# Altium footprint library MMT_Connectors_Buttons_Switches.PcbLib: 46 footprints (part 1 of 3)
Each footprint in its own frame and in the unit in brackets; x right, y up, seen from the top. Pads: shape width x height; smd on the part's side, far side on the other; paste and mask are expansions set on the pad; w line width, h text height; cw(c..) or ccw(c..) is an arc to the next point about the centre after c.
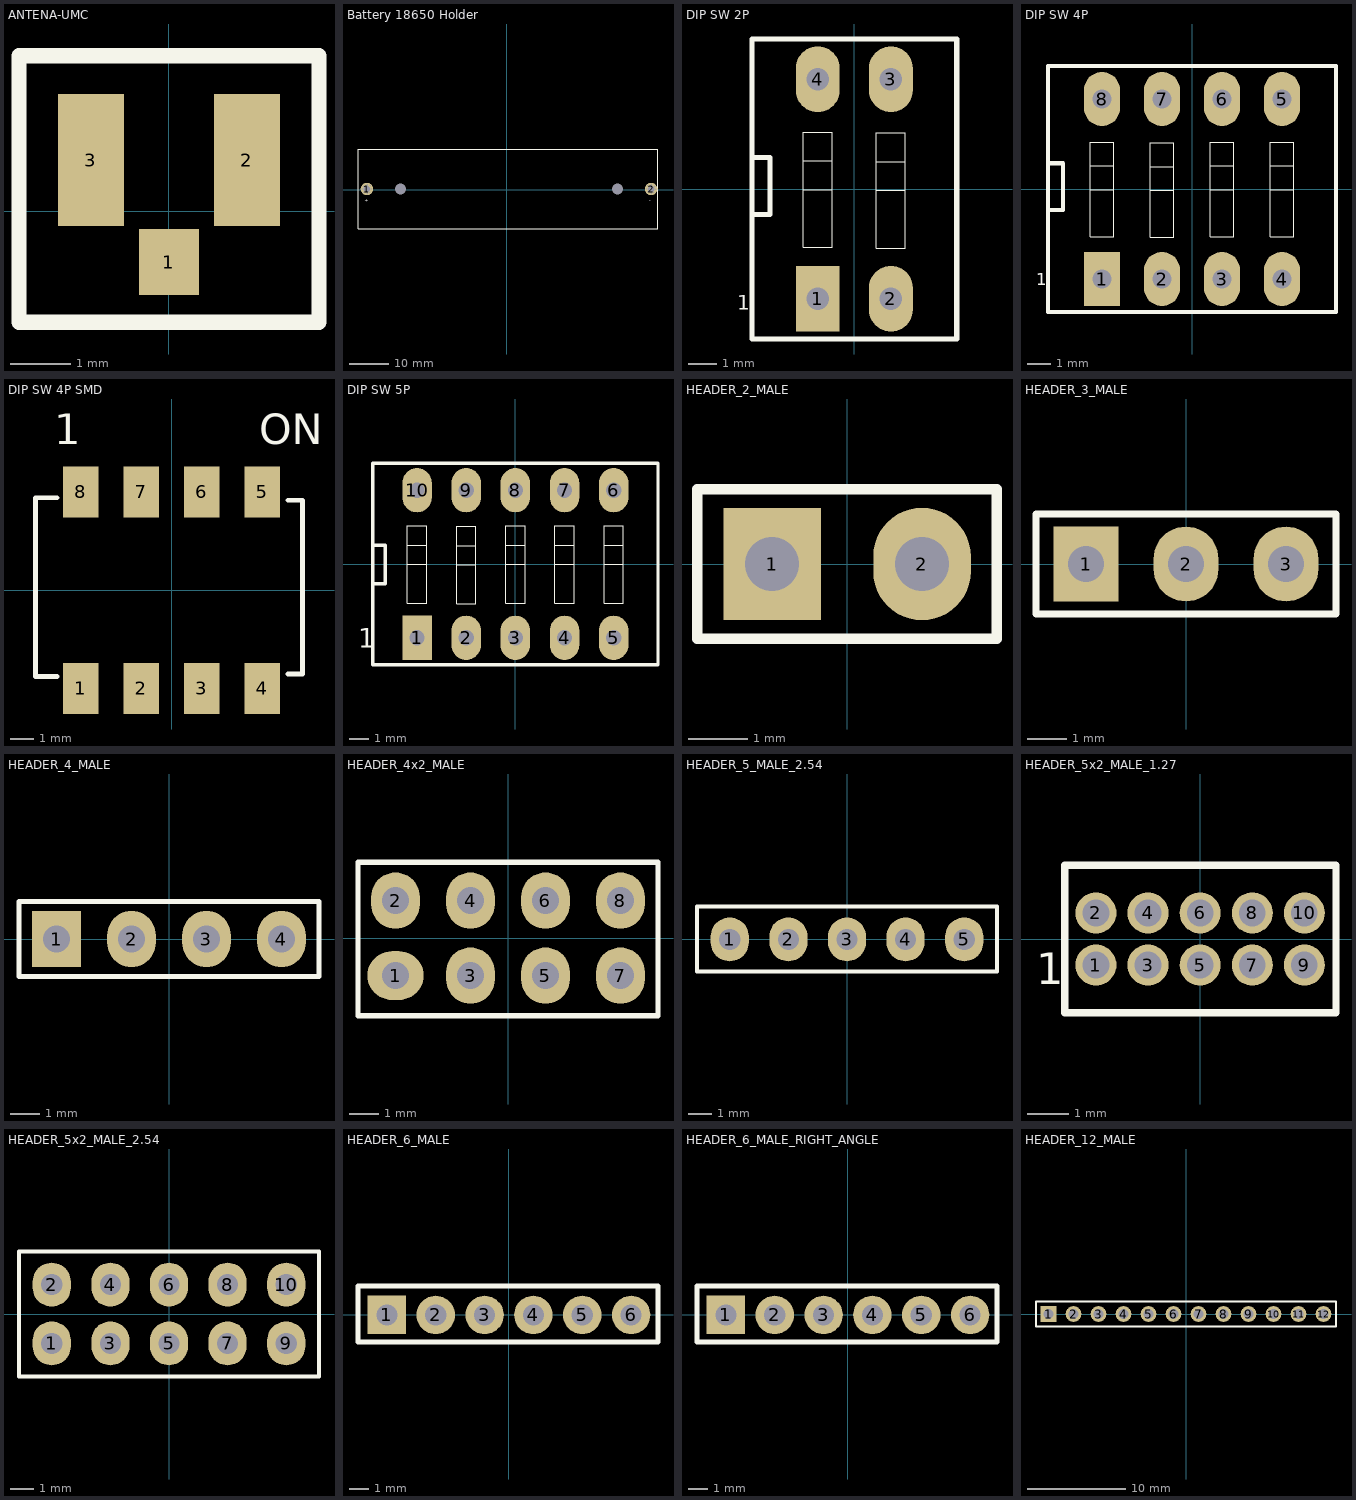
[diagram p0: the footprints below, top view; thin cyan lines are the x and y axes]

## ANTENA-UMC [mm] "Ultra Small Coaxial RF Connector 1-6GHz 50R Male 3-Pad"
height 1.35
pads (3):
  rect 1x1.1 smd: 1(0,-0.85)
  rect 1.1x2.2 smd: 2(1.3,0.85) 3(-1.3,0.85)
Top Overlay:
  lines w0.254: -2.5,-1.854 2.5,-1.854 2.5,2.591 -2.5,2.591 -2.5,-1.854
3D body "UMC-IPEX.step": height 1.25, standoff -0.01, extent -1.5,-0.737 1.5,2.363

## Battery 18650 Holder [mm]
pads (4):
  round 0 hole 2.8: 0(-27.178,0.254) 0(28.448,0.254)
  round 3.2 hole 1.7: 1(-35.814,0.254) 2(37.084,0.254)
via 36.297,-0.508 diameter 0.762 hole 0.381
via 37.821,-0.559 diameter 0.762 hole 0.381
via 37.973,0.991 diameter 0.762 hole 0.381
via 36.271,1.092 diameter 0.762 hole 0.381
via 35.916,0.254 diameter 0.762 hole 0.381
via 37.109,-0.94 diameter 0.762 hole 0.381
via 38.252,0.203 diameter 0.762 hole 0.381
via 37.084,1.448 diameter 0.762 hole 0.381
via -36.703,1.016 diameter 0.762 hole 0.381
via -35.052,-0.584 diameter 0.762 hole 0.381
via -36.652,-0.559 diameter 0.762 hole 0.381
via -37.033,0.254 diameter 0.762 hole 0.381
via -35.789,-0.914 diameter 0.762 hole 0.381
via -34.696,0.254 diameter 0.762 hole 0.381
via -34.95,1.041 diameter 0.762 hole 0.381
via -35.763,1.397 diameter 0.762 hole 0.381
Top Overlay:
  lines w0.254: -38.1,-9.906 38.862,-9.906 38.862,10.414 -38.1,10.414 -38.1,0.254 -38.1,-9.906
  text "-" at 36.576,-3.048 h0.8
  text "+" at -36.322,-3.048 h0.8
3D body "KEYELCO_1043.STEP": height 14.86, standoff -3.61, extent -38.273,-10.16 38.781,10.49
3D body "PANASONIC_NCR-18650B.STEP": height 18.65, standoff 0.35, extent -32.246,-8.985 32.754,9.315

## DIP SW 2P [mil] "2 PIN, W 400mil , L 450mil, Pin to pin 100mil For Switch"
pads (4):
  rect 60x90 hole 31: 1(-50,-150)
  oval 60x90 hole 31: 2(50,-150) 3(50,150) 4(-50,150)
Top Overlay:
  lines w1.5: -69.69,-1 -30.32,-1 ; -69.69,38.37 -30.32,38.37 ; 30.32,-2 69.69,-2 ; 30.32,37.37 69.69,37.37 ; -69.69,-79.74 -69.69,77.74 -30.32,77.74 -30.32,-79.74 -69.69,-79.74 ; 30.32,-80.74 30.32,76.74 69.69,76.74 69.69,-80.74 30.32,-80.74
  lines w7: -140,-35 -115,-35 -115,43 -139,43 ; -140,-205 -140,205 140,205 140,-205 -140,-205
  text "1" at -160,-165 h20
3D body "70354924.stp": height 236.22, standoff -125.98, extent -130.7,-194.88 130.71,194.89

## DIP SW 4P [mil] "4 PIN, W 400mil , L 450mil, Pin to pin 100mil For Switch"
pads (8):
  rect 60x90 hole 31: 1(-150,-150)
  oval 60x90 hole 31: 2(-50,-150) 3(50,-150) 4(150,-150) 5(150,150) 6(50,150) 7(-50,150) 8(-150,150)
Top Overlay:
  lines w1.5: -169.69,-1 -130.31,-1 ; -169.69,38.37 -130.31,38.37 ; -69.69,-2 -30.32,-2 ; -69.69,37.37 -30.32,37.37 ; 30.32,-1 69.69,-1 ; 30.32,38.37 69.69,38.37 ; 130.31,-1 169.69,-1 ; 130.31,38.37 169.69,38.37 ; -169.69,-79.74 -169.69,77.74 -130.31,77.74 -130.31,-79.74 -169.69,-79.74 ; -69.69,-80.74 -69.69,76.74 -30.32,76.74 -30.32,-80.74 -69.69,-80.74 ; 30.32,-79.74 30.32,77.74 69.69,77.74 69.69,-79.74 30.32,-79.74 ; 130.31,-79.74 130.31,77.74 169.69,77.74 169.69,-79.74 130.31,-79.74
  lines w7: -240,-35 -215,-35 -215,43 -239,43 ; -240,-205 -240,205 240,205 240,-205 -240,-205
  text "1" at -260,-160 h20
3D body "70354927.stp": height 236.22, standoff -125.98, extent -231.77,-194.88 229.65,194.89

## DIP SW 4P SMD [mm]
pads (8):
  rect 1.5x2.15 smd: 1(-3.81,-4.125) 2(-1.27,-4.125) 3(1.27,-4.125) 4(3.81,-4.125) 5(3.81,4.125) 6(1.27,4.125) 7(-1.27,4.125) 8(-3.81,4.125)
Top Overlay:
  lines w0.2: -4.81,-3.625 -5.71,-3.625 -5.71,3.875 -4.81,3.875 ; 4.89,-3.525 5.49,-3.525 5.49,3.775 4.89,3.775
  text "1" at -4.93,6.125 h1.27
  text "ON" at 3.67,6.125 h1.27
3D body "User Library-DM04V.step": height 4.52, standoff 0, extent -5.56,-4.915 5.54,4.865

## DIP SW 5P [mil] "10 PIN, W 400mil , L 450mil, Pin to pin 100mil For Switch"
pads (10):
  rect 60x90 hole 31: 1(-200,-150)
  oval 60x90 hole 31: 2(-100,-150) 3(0,-150) 4(100,-150) 5(200,-150) 6(200,150) 7(100,150) 8(0,150) 9(-100,150) 10(-200,150)
Top Overlay:
  lines w1.5: -219.69,-1 -180.31,-1 ; -219.69,38.37 -180.31,38.37 ; -119.69,-2 -80.31,-2 ; -119.69,37.37 -80.31,37.37 ; -19.68,-1 19.68,-1 ; -19.68,38.37 19.68,38.37 ; 80.31,-1 119.69,-1 ; 80.31,38.37 119.69,38.37 ; 180.31,-1 219.69,-1 ; 180.31,38.37 219.69,38.37 ; -219.69,-79.74 -219.69,77.74 -180.31,77.74 -180.31,-79.74 -219.69,-79.74 ; -119.69,-80.74 -119.69,76.74 -80.31,76.74 -80.31,-80.74 -119.69,-80.74 ; -19.68,-79.74 -19.68,77.74 19.68,77.74 19.68,-79.74 -19.68,-79.74 ; 80.31,-79.74 80.31,77.74 119.69,77.74 119.69,-79.74 80.31,-79.74 ; 180.31,-79.74 219.69,-79.74 219.69,77.74 180.31,77.74 180.31,-79.74
  lines w7: -290,-40 -265,-40 -265,38 -289,38 ; -290,-205 -290,205 290,205 290,-205 -290,-205
  text "1" at -320,-170 h39.37
3D body "User Library-Switch DIP 5 way flat slide Thru-Hole-19624.STEP": height 262.24, standoff -100, extent -281.42,-194.89 279.99,194.88

## HEADER_2_MALE [mil]
pads (2):
  rect 65x75 hole 36: 1(-50,0)
  oval 65x75 hole 36: 2(50,0)
Top Overlay:
  lines w7: -100,-50 100,-50 100,50 -100,50 -100,-50
3D body "JP2.stp": height 323.44, standoff -117.51, extent -98.03,-50 98.03,48.43

## HEADER_3_MALE [mil]
height 200
pads (3):
  rect 65x75 hole 36: 1(-100,0)
  oval 65x75 hole 36: 2(0,0) 3(100,0)
Top Overlay:
  lines w7: -150,-50 150,-50 150,50 -150,50 -150,-50
3D body "User Library-PinHeaderX3.STEP": height 355.04, standoff -124.88, extent -150,-59.96 150,55

## HEADER_4_MALE [mil]
height 200
pads (4):
  rect 65x75 hole 36: 1(-150,0)
  oval 65x75 hole 36: 2(-50,0) 3(50,0) 4(150,0)
Top Overlay:
  lines w7: -200,-50 200,-50 200,50 -200,50 -200,-50
3D body "JP4.stp": height 323.44, standoff -117.51, extent -198.03,-48.43 198.03,50

## HEADER_4x2_MALE [mil]
height 200
pads (8):
  oval 75x65 hole 36: 1(-150,-50)
  oval 65x75 hole 36: 2(-150,50) 3(-50,-50) 4(-50,50) 5(50,-50) 6(50,50) 7(150,-50) 8(150,50)
Top Overlay:
  lines w7: -200,-103.54 200,-103.54 200,101.18 -200,101.18 -200,-103.54
3D body "User Library-2_54mm Male Header (4x2).STEP": height 339.99, standoff -114.34, extent -200,-99.61 200,96.45

## HEADER_5_MALE_2.54 [mil]
height 200
pads (5):
  oval 65x75 hole 36: 1(-200,0) 2(-100,0) 3(0,0) 4(100,0) 5(200,0)
Top Overlay:
  lines w7: -255.91,-55.12 -255.91,56.3 255.91,56.3 255.91,-55.12 -255.91,-55.12
3D body "65785.stp": height 116.93, standoff -337.4, extent -249.99,-49.99 250.01,50.01

## HEADER_5x2_MALE_1.27 [mm]
height 5.08
pads (10):
  round 1 hole 0.65: 1(-2.54,-0.635) 2(-2.54,0.635) 3(-1.27,-0.635) 4(-1.27,0.635) 5(0,-0.635) 6(0,0.635) 7(1.27,-0.635) 8(1.27,0.635) 9(2.54,-0.635) 10(2.54,0.635)
Top Overlay:
  lines w0.178: 3.3,1.8 -3.3,1.8 -3.3,-1.8 3.31,-1.8 3.31,1.8
  text "1" at -4,-1.1 h0.76
3D body "2002111100010t8lf.stp": height 5.5, standoff -2.35, extent -3.175,-1.7 3.175,1.7

## HEADER_5x2_MALE_2.54 [mil]
height 200
pads (10):
  oval 65x75 hole 36: 1(-200,-50) 2(-200,50) 3(-100,-50) 4(-100,50) 5(0,-50) 6(0,50) 7(100,-50) 8(100,50) 9(200,-50) 10(200,50)
Top Overlay:
  lines w7: -255.91,-106.3 255.91,-106.3 255.91,106.3 -255.91,106.3 -255.91,-106.3
3D body "User Library-Pin header 2x5 pinos reto pitch 2_54.step": height 373.85, standoff -125.98, extent -250,-100 250,100

## HEADER_6_MALE [mm]
pads (6):
  rect 2x2 hole 1.1: 1(-6.35,0)
  round 2 hole 1.1: 2(-3.81,0) 3(-1.27,0) 4(1.27,0) 5(3.81,0) 6(6.35,0)
Top Overlay:
  lines w0.254: -7.85,-1.4 -7.85,1.5 7.747,1.5 7.747,-1.4 5.65,-1.4 -7.85,-1.4
3D body "65787.stp": height 8.57, standoff -2.97, extent -7.64,-1.25 7.6,1.29

## HEADER_6_MALE_RIGHT_ANGLE [mm]
pads (6):
  rect 2x2 hole 1.1: 1(-6.35,0)
  round 2 hole 1.1: 2(-3.81,0) 3(-1.27,0) 4(1.27,0) 5(3.81,0) 6(6.35,0)
Top Overlay:
  lines w0.254: -7.85,-1.4 -7.85,1.5 7.747,1.5 7.747,-1.4 5.65,-1.4 -7.85,-1.4
3D body "7731581806lf.stp": height 4.25, standoff -5.83, extent -7.42,-1.2 7.42,4.269

## HEADER_12_MALE [mm] "Connector; Header; 12 Position"
pads (12):
  rect 1.6x1.6 hole 1: 1(-13.97,0)
  round 1.6 hole 1: 2(-11.43,0) 3(-8.89,0) 4(-6.35,0) 5(-3.81,0) 6(-1.27,0) 7(1.27,0) 8(3.81,0) 9(6.35,0) 10(8.89,0) 11(11.43,0) 12(13.97,0)
Top Overlay:
  lines w0.2: -15.24,-1.27 -15.24,1.27 -13.335,1.27 15.24,1.27 15.24,-1.27 -15.24,-1.27
3D body "User Library-Header_Fem_1X6.STEP": height 8.5, standoff -3.2, extent -15.49,-1.27 0.25,1.27
3D body "User Library-Header_Fem_1X6.STEP": height 8.5, standoff -3.2, extent -0.203,-1.27 15.537,1.27